# Altium footprint library Connectors - USB DVI HDMI.PcbLib: 20 footprints (part 1 of 2)
Each footprint in its own frame and in the unit in brackets; x right, y up, seen from the top. Pads: shape width x height; smd on the part's side, far side on the other; paste and mask are expansions set on the pad; w line width, h text height; cw(c..) or ccw(c..) is an arc to the next point about the centre after c.
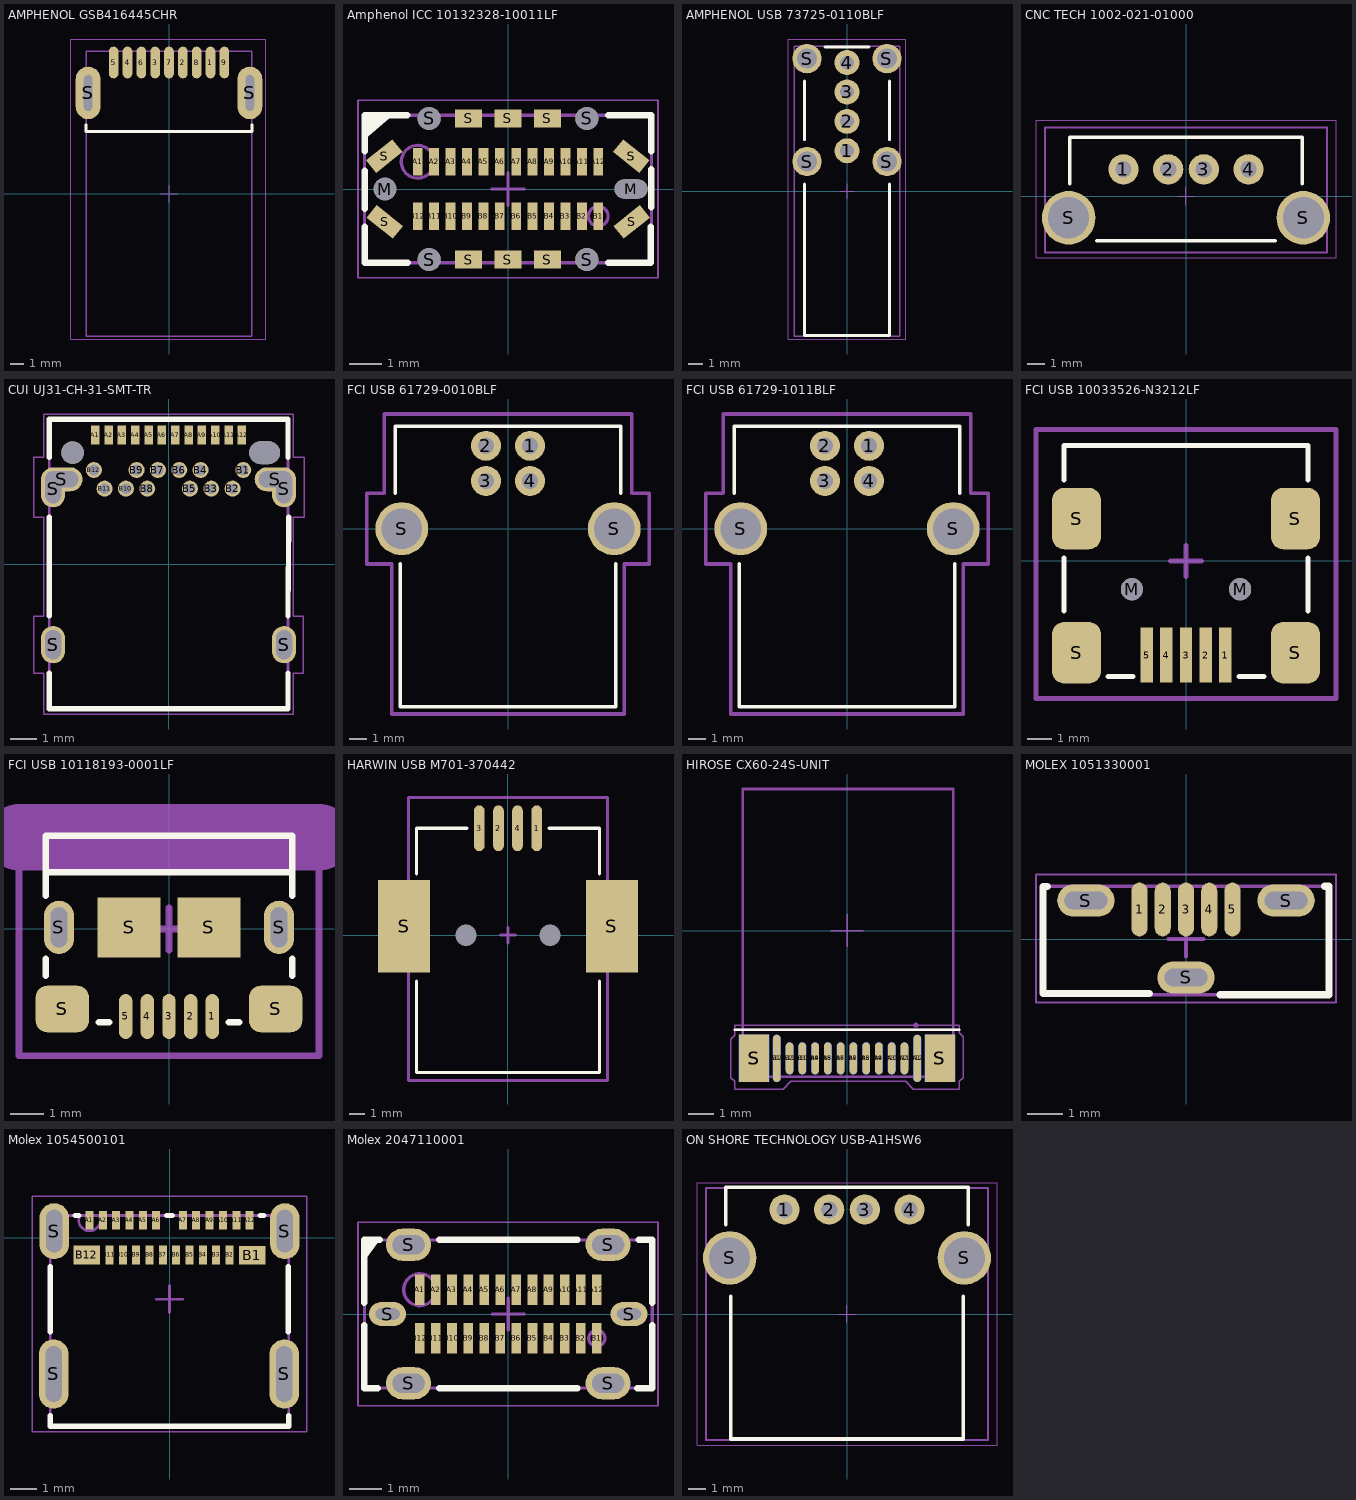
[diagram p0: the footprints below, top view; thin cyan lines are the x and y axes]

## AMPHENOL GSB416445CHR [mm] "USB 3.0 Type A"
height 4
pads (11):
  oval 0.7x2.3 smd: 1(3,9.5) 2(1,9.5) 3(-1,9.5) 4(-3,9.5) 5(-4,9.5) 6(-2,9.5) 7(0,9.5) 8(2,9.5) 9(4,9.5)
  oval 1.8x3.8 hole 2.6 slot 0.6 at 0 deg: S(-5.85,7.3) S(5.85,7.3)
Top Overlay:
  lines w0.2: -6,5 -6,4.5 6,4.5 6,5
Mechanical 13:
  lines w0.1: -6,-10.3 6,-10.3 6,10.3 -6,10.3 -6,-10.3
  lines w0.2: -6,4.5 6,4.5
Mechanical 15:
  lines w0.05: -0.635,0 0.635,0 ; 0,-0.635 0,0.635 ; -7.1,-10.5 -7.1,11.2 7,11.2 7,-10.5 -7.1,-10.5
3D body "Amphenol - GSB416445CHR.step": height 1.88, standoff -2.63, extent -6,-10.325 6,10.325

## Amphenol ICC 10132328-10011LF [mm] "USB-C  Receptacle Connector 24 Position Surface Mount - Through Hole, 24 Contacts, Body 8.74x2.96mm"
height 8.8
pads (40):
  rect 0.3x0.85 smd: A1(-2.75,0.83) A2(-2.25,0.83) A3(-1.75,0.83) A4(-1.25,0.83) A5(-0.75,0.83) A6(-0.25,0.83) A7(0.25,0.83) A8(0.75,0.83) A9(1.25,0.83) A10(1.75,0.83) A11(2.25,0.83) A12(2.75,0.83) B1(2.75,-0.83) B2(2.25,-0.83) B3(1.75,-0.83) B4(1.25,-0.83) B5(0.75,-0.83) B6(0.25,-0.83) B7(-0.25,-0.83) B8(-0.75,-0.83) B9(-1.25,-0.83) B10(-1.75,-0.83) B11(-2.25,-0.83) B12(-2.75,-0.83)
  round 0.66 hole 0.7: M(-3.75,0)
  oval 1x0.58 hole 0.58 slot 1 at 0 deg unplated: M(3.75,0)
  rect 1.03x0.5 smd rot 39: S(-3.77,1) S(3.77,-1)
  rect 1.03x0.5 smd rot 141: S(-3.75,-1) S(3.75,1)
  round 0.7 hole 0.7 unplated: S(-2.4,-2.15) S(-2.4,2.15) S(2.4,-2.15) S(2.4,2.15)
  rect 0.82x0.55 smd: S(-1.2,-2.15) S(-1.2,2.15) S(0,-2.15) S(0,2.15) S(1.2,-2.15) S(1.2,2.15)
Top Overlay:
  region: -4.37,1.522 -4.37,2.25 -3.509,2.25
  lines w0.2: -4.37,-1.15 -4.37,-2.25 -3.05,-2.25 ; -4.37,-0.6 -4.37,0.55 ; -4.37,1.15 -4.37,2.25 -3.07,2.25 ; 3.05,-2.25 4.35,-2.25 4.35,-1.15 ; 3.05,2.25 4.37,2.25 4.37,1.15 ; 4.37,-0.55 4.37,0.6
Mechanical 13:
  circle w0.1: c2.75,-0.83 r0.3
  circle w0.1: c-2.75,0.83 r0.5
  lines w0.1: -4.37,-2.25 4.37,-2.25 4.37,2.25 -4.37,2.25 -4.37,-2.25
Mechanical 15:
  lines w0.05: -4.57,-2.7 4.57,-2.7 4.57,2.7 -4.57,2.7 -4.57,-2.7
  lines w0.1: -0.5,0 0,0 ; 0,-0.5 0,0 ; 0,0.5 0,0 ; 0.5,0 0,0
3D body "Amphenol ICC - 10132328-10011LF v5.step": height 8.95, standoff -1.23, extent -4.37,-2.25 4.37,2.25

## AMPHENOL USB 73725-0110BLF [mm] "USB2.0 TYPEA 4 Pin Pitch 2mm"
height 15
pads (8):
  round 1.7 hole 0.92: 1(0,2.75) 2(0,4.75) 3(0,6.75) 4(0,8.75)
  round 2 hole 1.35: S(-2.72,2.02) S(-2.72,9.02) S(2.72,2.02) S(2.72,9.02)
Top Overlay:
  lines w0.2: -2.9,0.5 -2.9,-9.8 2.9,-9.8 2.9,0.5 ; -2.9,3.5 -2.9,7.5 ; -1.5,9.8 1.5,9.8 ; 2.9,3.5 2.9,7.5
Mechanical 13:
  lines w0.1: -3.6,-9.85 -3.6,9.85 3.6,9.85 3.6,-9.85 -3.6,-9.85
Mechanical 15:
  lines w0.05: -0.5,0 0.5,0 ; 0,-0.5 0,0.5 ; -4,-10.05 -4,10.35 4,10.35 4,-10.05 -4,-10.05
3D body "Amphenol - 73725-0110BLF.step": height 14.53, standoff -3.28, extent -3.56,-9.85 3.56,9.85

## CNC TECH 1002-021-01000 [mm] "USB2.0 TYPEA 4 Pin Pitch 2-2.5mm"
height 15
pads (6):
  round 1.7 hole 0.92: 1(-3.5,1.505) 2(-1,1.505) 3(1,1.505) 4(3.5,1.505)
  round 3 hole 2.3: S(-6.57,-1.205) S(6.57,-1.205)
Top Overlay:
  lines w0.2: -6.5,0.7 -6.5,3.3 6.5,3.3 6.5,0.7 ; -5,-2.5 5,-2.5
Mechanical 13:
  lines w0.1: -7.9,-3.145 -7.9,3.855 7.9,3.855 7.9,-3.145 -7.9,-3.145
Mechanical 15:
  lines w0.05: -0.5,0.005 0.5,0.005 ; 0,-0.495 0,0.505 ; -8.4,-3.445 -8.4,4.255 8.4,4.255 8.4,-3.445 -8.4,-3.445
3D body "CNC Tech - 1002-021-01000.step": height 15, standoff -3.9, extent -7.895,-3.145 7.895,3.855

## CUI UJ31-CH-31-SMT-TR [mm] "USB-C Receptacle Connector, 24 Postions, Body 8.96x10.85mm, SMD Pitch 0.5mm, TH Pitch 0.4mm"
height 3.16
pads (32):
  rect 0.32x0.7 smd: A1(-2.75,4.835) A2(-2.25,4.835) A3(-1.75,4.835) A4(-1.25,4.835) A5(-0.75,4.835) A6(-0.25,4.835) A7(0.25,4.835) A8(0.75,4.835) A9(1.25,4.835) A10(1.75,4.835) A11(2.25,4.835) A12(2.75,4.835)
  round 0.6 hole 0.4: B1(2.8,3.525) B2(2.4,2.825) B3(1.6,2.825) B4(1.2,3.525) B5(0.8,2.825) B6(0.4,3.525) B7(-0.4,3.525) B8(-0.8,2.825) B9(-1.2,3.525) B10(-1.6,2.825) B11(-2.4,2.825) B12(-2.8,3.525)
  oval 0.9x1.4 hole 0.6 slot 1.1 at 90 deg: S(-4.33,-3.025) S(-4.33,2.825) S(4.33,2.825) S(4.33,-3.025)
  oval 1.55x0.9 hole 0.6 slot 1.25 at 0 deg: S(-4.005,3.175) S(4.005,3.175)
  round 0.85 hole 0.85 unplated: ""(-3.6,4.175)
  oval 1.15x0.85 hole 0.85 slot 1.15 at 0 deg unplated: ""(3.6,4.175)
Top Overlay:
  lines w0.2: -4.48,-4.1 -4.48,-5.425 4.48,-5.425 4.48,-4.1 ; -4.48,-1.95 -4.48,1.75 ; -4.48,4 -4.48,5.425 4.48,5.425 4.48,4 ; 4.48,-1.95 4.5,1.75
Mechanical 13:
  circle w0.1: c-2.75,4.935 r0.05
  lines w0.1: -4.48,-5.425 -4.48,5.425 4.48,5.425 4.48,-5.425 -4.48,-5.425
Mechanical 15:
  lines w0.05: -5.05,-4.1 -5.05,-1.95 -4.68,-1.95 -4.68,1.75 -5.05,1.75 -5.05,4 -4.68,4 -4.68,5.625 4.68,5.625 4.68,4 5.08,4 5.08,1.75 4.68,1.75 4.68,-1.95 5.05,-1.95 5.05,-4.1 4.68,-4.1 4.68,-5.625 -4.68,-5.625 -4.68,-4.1 -5.05,-4.1
3D body "CUI - UJ31-CH-G1-SMT-TR.stp": height 3.2, standoff -0.88, extent -4.48,-5.425 4.48,5.425

## FCI USB 61729-0010BLF [mm]
height 11
pads (6):
  round 1.7 hole 0.92: 1(1.25,4.7) 2(-1.25,4.7) 3(-1.25,2.71) 4(1.25,2.71)
  round 3 hole 2.3: S(-6.02,0) S(6.02,0)
Top Overlay:
  lines w0.2: -6.4,2 -6.4,5.8 6.4,5.8 6.4,2 ; -6.1,-2 -6.1,-10.1 6.1,-10.1 6.1,-2
Mechanical 15:
  lines w0.2: -8,-2 -8,2 -7,2 -7,6.5 0,6.5 7,6.5 7,2 8,2 8,-2 6.6,-2 6.6,-10.5 0,-10.5 -6.6,-10.5 -6.6,-2 -8,-2
3D body "FCI 61729-0010BLF.STEP": height 11, standoff -2.8, extent -6.56,-10.175 6.56,5.765

## FCI USB 61729-1011BLF [mm]
height 11
pads (6):
  round 1.7 hole 0.92: 1(1.25,4.7) 2(-1.25,4.7) 3(-1.25,2.71) 4(1.25,2.71)
  round 3 hole 2.3: S(-6.02,0) S(6.02,0)
Top Overlay:
  lines w0.2: -6.4,2 -6.4,5.8 6.4,5.8 6.4,2 ; -6.1,-2 -6.1,-10.1 6.1,-10.1 6.1,-2
Mechanical 15:
  lines w0.2: -8,-2 -6.6,-2 -6.6,-10.5 0,-10.5 6.6,-10.5 6.6,-2 8,-2 8,2 7,2 7,6.5 0,6.5 -7,6.5 -7,2 -8,2 -8,-2
3D body "FCI 61729-1011BLF.STEP": height 11, standoff -2.8, extent -6.56,-10.175 6.56,5.765

## FCI USB 10033526-N3212LF [mm] "USB 2.0 Type B Mini"
height 3.95
pads (11):
  rect 0.5x2.25 smd: 1(1.6,-3.826) 2(0.8,-3.826) 3(0,-3.826) 4(-0.8,-3.826) 5(-1.6,-3.826)
  round 0.9 hole 0.9 unplated: M(-2.2,-1.151) M(2.2,-1.151)
  rrect50% 2x2.5 smd: S(-4.45,-3.731) S(-4.45,1.719) S(4.45,-3.731) S(4.45,1.719)
Top Overlay:
  lines w0.2: -4.953,-2.04 -4.953,0.119 ; -4.953,3.294 -4.953,4.691 4.953,4.691 4.953,3.294 ; -3.175,-4.707 -2.159,-4.707 ; 2.159,-4.707 3.175,-4.707 ; 4.953,-2.04 4.953,0.119
Mechanical 15:
  lines w0.2: -0.635,0 0.635,0 ; 0,-0.635 0,0.635 ; -6.096,-5.588 6.096,-5.588 6.096,5.334 -6.096,5.334 -6.096,-5.588
3D body "FCI USB 10033526-N3212LF.STEP": height 4.01, standoff -0.99, extent -4.95,-4.701 4.95,4.699

## FCI USB 10118193-0001LF [mm] "USB 2.0 Type B Micro"
height 3.1
pads (11):
  oval 0.4x1.35 smd: 1(1.3,-2.625) 2(0.65,-2.625) 3(0,-2.625) 4(-0.65,-2.625) 5(-1.3,-2.625)
  oval 0.9x1.6 hole 0.5 slot 1.2 at 90 deg: S(-3.3,0.05) S(3.3,0.05)
  rrect50% 1.6x1.4 smd: S(-3.2,-2.4) S(3.2,-2.4)
  rect 1.9x1.8 smd: S(-1.2,0.05) S(1.2,0.05)
Top Overlay:
  lines w0.2: -3.7,-1.4 -3.7,-0.9 ; -3.7,1 -3.7,1.7 ; -2.1,-2.8 -1.8,-2.8 ; 1.8,-2.8 2.1,-2.8 ; 3.7,-1.4 3.7,-0.9 ; 3.7,1 3.7,1.7 ; -3.7,1.7 3.7,1.7 ; -3.7,1.7 -3.7,2.8 3.7,2.8 3.7,1.7
Mechanical 15:
  lines w0.2: -0.635,0 0.635,0 ; 0,-0.635 0,0.635 ; -4.5,-3.8 -4.5,3.2 4.5,3.2 4.5,-3.8 -4.5,-3.8
Mechanical 31:
  lines w2: -4.5,2.754 0,2.754 4.5,2.754
3D body "FCI USB 10118193-0001lfc.STEP": height 2.78, standoff -0.82, extent -3.929,-2.9 3.928,2.76

## HARWIN USB M701-370442 [mm]
height 11
pads (8):
  oval 0.7x3 smd: 1(1.875,7) 2(-0.625,7) 3(-1.875,7) 4(0.625,7)
  rect 0x0 hole 1.4 unplated: M(-2.75,0) M(2.75,0)
  rect 3.4x6.04 smd: S(-6.8,0.58) S(6.8,0.58)
Top Overlay:
  lines w0.2: -6,-3 -6,-9 0,-9 6,-9 6,-3 ; -6,4 -6,7 -2.7,7 ; 2.7,7 6,7 6,4
Mechanical 15:
  lines w0.2: -0.5,0 0.5,0 ; 0,-0.5 0,0.5 ; -6.5,-9.5 0,-9.5 6.5,-9.5 6.5,9 0,9 -6.5,9 -6.5,-9.5
3D body "Harwin M701-370442.STEP": height 11, standoff -1.5, extent -8.1,-9 8.1,8.15

## HIROSE CX60-24S-UNIT [mm]
height 2.4
pads (28):
  oval 0.3x1.85 smd: A1(2.75,-5) A12(-2.75,-5)
  oval 0.3x1.25 smd: A2(2.25,-5) A3(1.75,-5) A4(1.25,-5) A5(0.75,-5) A6(0.25,-5) A7(-0.25,-5) A8(-0.75,-5) A9(-1.25,-5) A10(-1.75,-5) A11(-2.25,-5)
  oval 0.3x1.85 smd far side: B1(-2.75,-5) B12(2.75,-5)
  oval 0.3x1.25 smd far side: B2(-2.25,-5) B3(-1.75,-5) B4(-1.25,-5) B5(-0.75,-5) B6(-0.25,-5) B7(0.25,-5) B8(0.75,-5) B9(1.25,-5) B10(1.75,-5) B11(2.25,-5)
  rect 1.18x1.85 smd: S(-3.64,-5) S(3.64,-5)
  rect 1.18x1.85 smd far side: S(-3.64,-5) S(3.64,-5)
Top Overlay:
  lines w0.1: -4.4,-3.875 4.4,-3.875
Mechanical 13:
  circle w0.1: c2.7,-3.7 r0.05
  lines w0.1: -4.4,-3.875 4.4,-3.875 ; -4.09,-5.715 4.16,-5.715 4.16,5.55 -4.09,5.55 -4.09,-5.715
Mechanical 15:
  lines w0.05: -0.635,0 0.635,0 ; 0,-0.635 0,0.635 ; -4.55,-5.75 -4.55,-4.25 -4.4,-4.1 -4.4,-3.7 4.4,-3.7 4.4,-4 4.55,-4.15 4.55,-5.75 4.4,-5.9 4.4,-6.2 2.6,-6.2 2.3,-5.9 -2.2,-5.9 -2.5,-6.2 -4.4,-6.2 -4.4,-5.9 -4.55,-5.75
3D body "Hirose - CX60-24S-UNIT.step": height 0.86, standoff -1.66, extent -4.11,-5.555 4.14,5.545

## MOLEX 1051330001 [mm] "micro B USB 2.0 Receptacle Connector, 5 Position, Body 8.00x2.90 mm"
height 6.7
pads (8):
  oval 0.45x1.5 smd: 1(-1.3,0.825) 2(-0.65,0.825) 3(0,0.825) 4(0.65,0.825) 5(1.3,0.825)
  oval 1.6x0.9 hole 0.5 slot 1.2 at 0 deg: S(-2.8,1.075) S(0,-1.075) S(2.8,1.075)
Top Overlay:
  lines w0.2: -3.875,1.469 -3.994,1.469 -3.994,-1.525 -1.025,-1.525 ; 0.95,-1.56 3.994,-1.56 3.994,1.475 3.875,1.475
Mechanical 13:
  lines w0.1: -3.994,-1.56 3.994,-1.56 3.994,1.469 -3.994,1.469 -3.994,-1.56
Mechanical 15:
  lines w0.05: -4.194,-1.775 4.194,-1.775 4.194,1.8 -4.194,1.8 -4.194,-1.775
  lines w0.1: -0.5,0 0,0 ; 0,-0.5 0,0 ; 0,0.5 0,0 ; 0.5,0 0,0
3D body "Molex - 1051330001 v2.step": height 6.75, standoff -1.65, extent -3.994,-1.56 3.994,1.469

## Molex 1054500101 [mm] "USB-C Receptacle Connector 24 Position Surface Mount, 24 Position, Body 8.94x7.90mm"
height 3.24
pads (28):
  rect 0.3x0.7 smd: A1(-3,0.655) A2(-2.5,0.655) A3(-2,0.655) A4(-1.5,0.655) A5(-1,0.655) A6(-0.5,0.655) A7(0.5,0.655) A8(1,0.655) A9(1.5,0.655) A10(2,0.655) A11(2.5,0.655) A12(3,0.655) B2(2.25,-0.645) B3(1.75,-0.645) B4(1.25,-0.645) B5(0.75,-0.645) B6(0.25,-0.645) B7(-0.25,-0.645) B8(-0.75,-0.645) B9(-1.25,-0.645) B10(-1.75,-0.645) B11(-2.25,-0.645)
  rect 1x0.7 smd: B1(3.1,-0.655) B12(-3.1,-0.645)
  oval 1.1x2.6 hole 2.1 slot 0.6 at 0 deg unplated: S(-4.34,-5.105) S(4.3,-5.105)
  oval 1.1x2.1 hole 1.6 slot 0.6 at 0 deg unplated: S(-4.32,0.245) S(4.32,0.245)
Top Overlay:
  lines w0.2: -4.47,-6.675 -4.47,-7.065 4.47,-7.065 4.47,-6.675 ; -4.47,-3.525 -4.47,-1.075 ; -3.54,0.835 -3.465,0.835 -3.4,0.835 ; -0.1,0.835 0,0.835 0.1,0.835 ; 3.39,0.835 3.465,0.835 3.53,0.835 ; 4.45,-3.525 4.45,-1.075
Mechanical 13:
  lines w0.1: -3.368,0.813 ccw(c-3,0.655) -2.632,0.813 ; -4.47,-7.065 -4.47,0.835 4.47,0.835 4.47,-7.065 -4.47,-7.065
Mechanical 15:
  lines w0.05: -5.15,-7.265 -5.15,1.55 5.15,1.55 5.15,-7.265 -5.15,-7.265
  lines w0.1: -0.5,-2.3 0,-2.3 ; 0,-2.8 0,-2.3 ; 0,-1.8 0,-2.3 ; 0.5,-2.3 0,-2.3
3D body "Molex - 1054500101 v7.step": height 3.21, standoff -0.75, extent -4.47,-7.065 4.47,0.835

## Molex 2047110001 [mm] "USB-C Receptacle Connector 24 Position Surface Mount, 24 Connectors, Body 4.60x9.05mm"
pads (30):
  rect 0.3x0.95 smd: A1(-2.75,0.755) A2(-2.25,0.755) A3(-1.75,0.755) A4(-1.25,0.755) A5(-0.75,0.755) A6(-0.25,0.755) A7(0.25,0.755) A8(0.75,0.755) A9(1.25,0.755) A10(1.75,0.755) A11(2.25,0.755) A12(2.75,0.755) B1(2.75,-0.755) B2(2.25,-0.755) B3(1.75,-0.755) B4(1.25,-0.755) B5(0.75,-0.755) B6(0.25,-0.755) B7(-0.25,-0.755) B8(-0.75,-0.755) B9(-1.25,-0.755) B10(-1.75,-0.755) B11(-2.25,-0.755) B12(-2.75,-0.755)
  oval 1.15x0.75 hole 0.35 slot 0.75 at 0 deg: S(-3.75,0) S(3.75,0)
  oval 1.4x1 hole 0.6 slot 1 at 0 deg: S(-3.1,-2.15) S(-3.1,2.15) S(3.1,-2.15) S(3.1,2.15)
Top Overlay:
  region: -4,2.3 -4.47,2.3 -4.47,1.63 -4.5,1.6
  lines w0.2: -4.47,-0.35 -4.47,-2.3 -4.05,-2.3 ; -4.47,0.35 -4.47,2.3 -4,2.3 ; -2.15,-2.3 2.15,-2.3 ; -2.15,2.3 2.15,2.3 ; 4,-2.3 4.47,-2.3 4.47,-0.35 ; 4.05,2.3 4.47,2.3 ; 4.47,0.35 4.47,2.3 ; 4.47,2.3 4.47,2.3 ; 4.47,2.3 4.47,2.3
Mechanical 13:
  circle w0.1: c2.75,-0.755 r0.25
  circle w0.1: c-2.75,0.755 r0.5
  lines w0.1: -4.47,-2.3 -4.47,2.3 4.47,2.3 4.47,-2.3 -4.47,-2.3
Mechanical 15:
  lines w0.05: -4.67,-2.85 -4.67,2.85 4.65,2.85 4.65,-2.85 -4.67,-2.85
  lines w0.1: -0.5,0 0,0 ; 0,-0.5 0,0 ; 0,0.5 0,0 ; 0.5,0 0,0
3D body "Molex - 2047110001 v9.step": height 9.05, standoff -1.4, extent -4.47,-2.3 4.47,2.3

## ON SHORE TECHNOLOGY USB-A1HSW6 [mm] "USB2.0 TYPEA 4 Pin Pitch 2-2.5mm"
height 7.1
pads (6):
  round 1.7 hole 0.92: 1(-3.5,5.85) 2(-1,5.85) 3(1,5.85) 4(3.5,5.85)
  round 3 hole 2.3: S(-6.57,3.14) S(6.57,3.14)
Top Overlay:
  lines w0.2: -6.8,5 -6.8,7.1 6.8,7.1 6.8,5 ; -6.5,1 -6.5,-7 6.5,-7 6.5,1
Mechanical 13:
  lines w0.1: -7.9,-7.05 7.9,-7.05 7.9,7.05 -7.9,7.05 -7.9,-7.05
Mechanical 15:
  lines w0.05: -0.5,0 0.5,0 ; 0,-0.5 0,0.5 ; -8.4,-7.35 8.4,-7.35 8.4,7.35 -8.4,7.35 -8.4,-7.35
3D body "On Shore - USB-A1HSW6.step": height 7.6, standoff -3.2, extent -7.9,-7.05 7.9,7.05

## PCBComponent_1 [mm]